# Altium footprint library Electronic Devices_LIB.PcbLib: 410 footprints (part 3 of 26)
Each footprint in its own frame and in the unit in brackets; x right, y up, seen from the top. Pads: shape width x height; smd on the part's side, far side on the other; paste and mask are expansions set on the pad; w line width, h text height; cw(c..) or ccw(c..) is an arc to the next point about the centre after c.
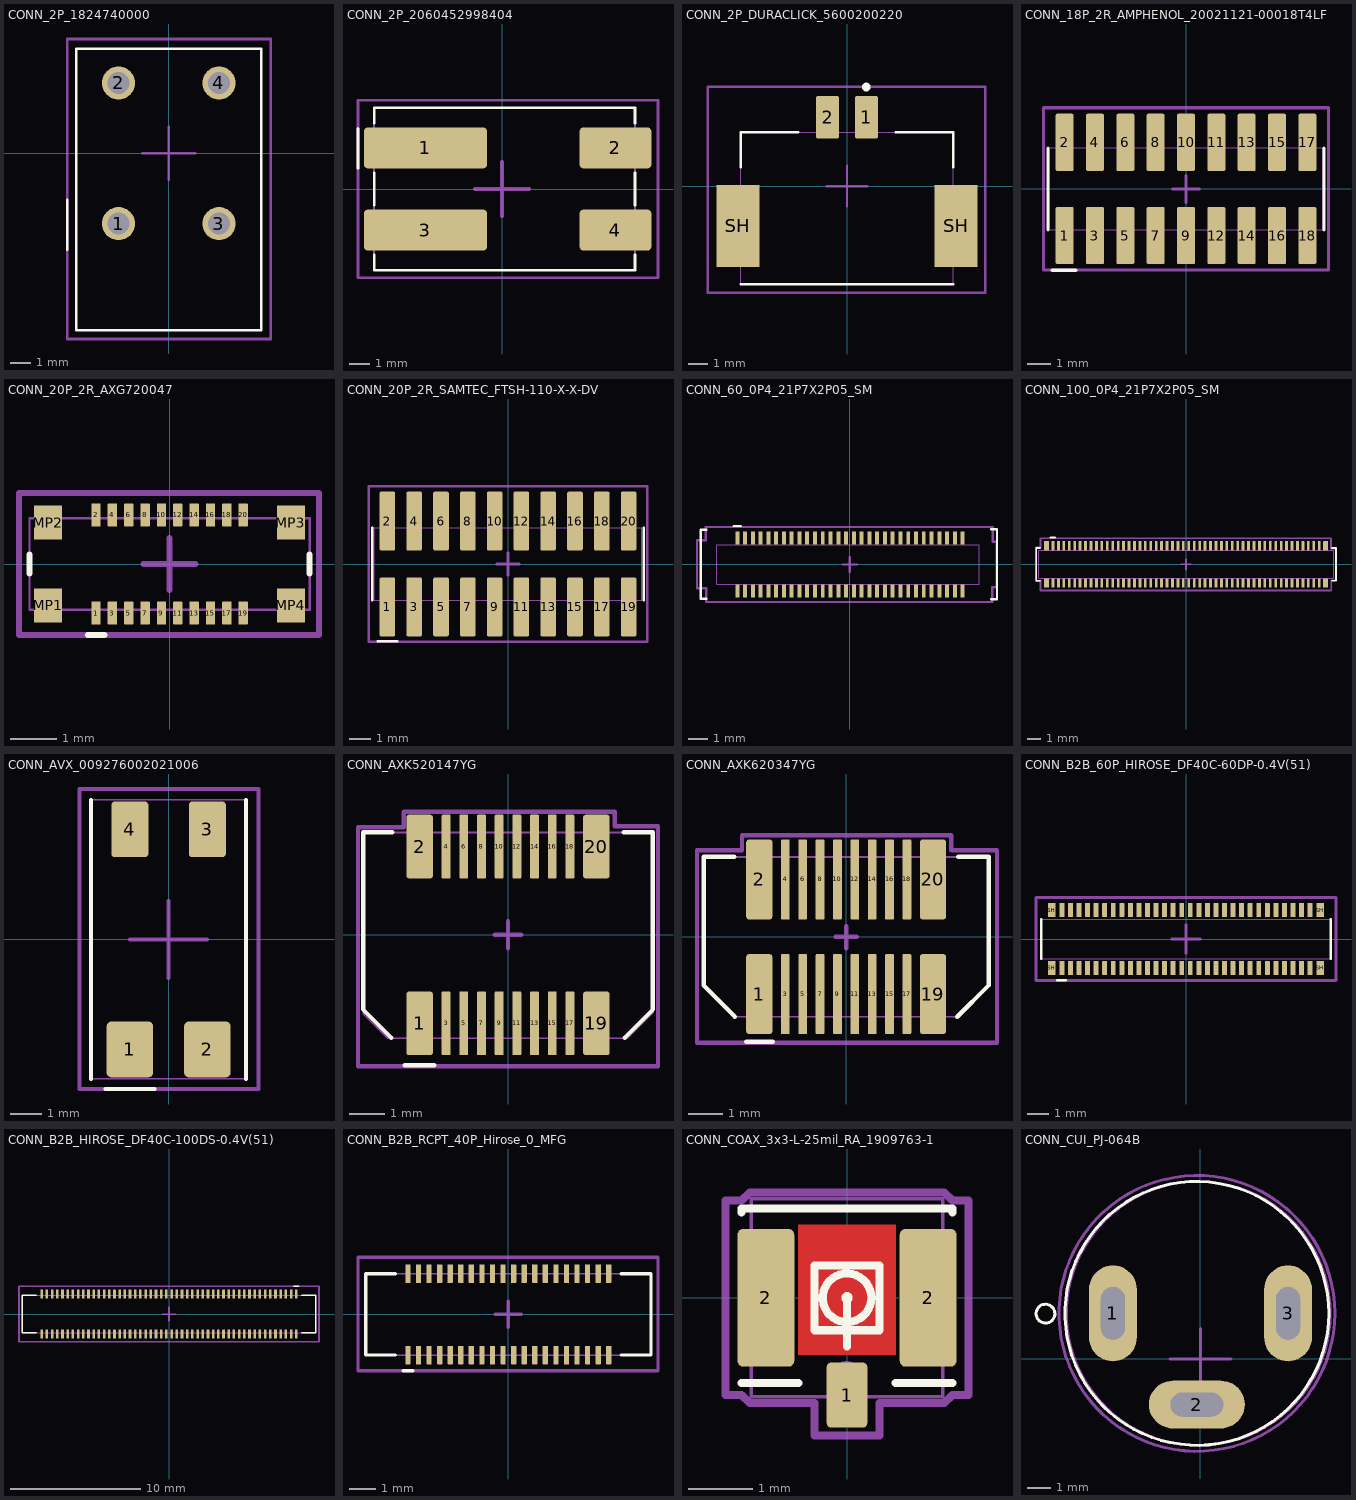
[diagram p2: the footprints below, top view; thin cyan lines are the x and y axes]

## CONN_2P_1824740000 [mm] "Horizontal with Board 0.197\" (5.00mm) Through Hole"
height 8.5
pads (4):
  round 1.65 hole 1.1: 1(-2.5,-3.5) 2(-2.5,3.5) 3(2.5,-3.5) 4(2.5,3.5)
Top Overlay:
  lines w0.127: -5.055,-4.801 -5.055,-2.311 ; -4.6,-8.8 4.6,-8.8 4.6,5.2 -4.6,5.2 -4.6,-8.8
Top Assembly:
  lines w0.051: -4.6,-8.8 -4.6,5.2 4.6,5.2 4.6,-8.8 -4.6,-8.8
  text ".Designator" at -2.246,-1.451 h0.51
Top Courtyard:
  lines w0.127: -1.321,0 0,0 ; 0,-1.321 0,0 ; 0,1.321 0,0 ; 1.321,0 0,0 ; -5.055,-9.246 5.08,-9.246 5.08,5.69 -5.055,5.69 -5.055,-9.246
3D body "1824740000.stp": height 12, standoff 0, extent -4.513,-8.824 4.587,5.176

## CONN_2P_2060452998404 [mm] "Terminal Block Horizontal with Board 0.157\" (4.00mm) Surface Mount"
height 4
pads (4):
  rrect20% 6x2 smd: 1(-3.725,2) 3(-3.725,-2)
  rrect20% 3.5x2 smd: 2(5.525,2) 4(5.525,-2)
Top Overlay:
  lines w0.127: -7.01,1.016 -7.01,2.946 ; -6.225,-3.2 -6.225,-3.95 6.475,-3.95 6.475,-3.2 ; -6.225,-0.8 -6.225,0.8 ; -6.225,3.2 -6.225,3.95 6.475,3.95 6.475,3.2 ; 6.475,-0.8 6.475,0.8
Top Assembly:
  text ".Designator" at -2.134,-0.059 h0.51
Top Courtyard:
  lines w0.127: -7.01,-4.318 7.595,-4.318 7.595,4.318 -7.01,4.318 -7.01,-4.318
  lines w0.2: -1.321,0 0,0 ; 0,-1.321 0,0 ; 0,1.321 0,0 ; 1.321,0 0,0
Top 3D Body:
  lines w0.1: -6.225,-3.95 6.475,-3.95 6.475,3.95 -6.225,3.95 -6.225,-3.95
3D body "2060-452_998-404.stp": height 4.5, standoff 0, extent -6.55,-3.95 6.55,3.95

## CONN_2P_DURACLICK_5600200220 [mm]
pads (4):
  rrect20% 1.2x2.2 smd: 1(1,3.53) 2(-1,3.53)
  rect 2.2x4.2 smd: SH(-5.6,-2.05) SH(5.6,-2.05)
Top Overlay:
  lines w0.127: -5.45,-5.05 5.45,-5.05 ; -5.45,0.95 -5.45,2.75 -2.5,2.75 ; 2.5,2.75 5.45,2.75 5.45,0.95
  lines w0.25: 0.891,5.08 ccw(c0.991,5.08) 1.091,5.08 ccw(c0.991,5.08) 0.891,5.08
Top Assembly:
  lines w0.051: -5.45,-5.05 5.45,-5.05 5.45,2.75 -5.45,2.75 -5.45,-5.05
  text ".Designator" at -2.667,-0.212 h0.51
Top Courtyard:
  lines w0.127: -1.041,0 0,0 ; 0,-1.041 0,0 ; 0,1.041 0,0 ; 1.041,0 0,0 ; -7.137,-5.486 -7.137,5.105 7.087,5.105 7.087,-5.486 -7.137,-5.486
3D body "560020-0220.stp": height 8, standoff 0, extent -5.45,-4.9 5.45,4.25

## CONN_18P_2R_AMPHENOL_20021121-00018T4LF [mm]
height 4.55
pads (18):
  rrect20% 0.76x2.4 smd: 1(-5.08,-1.95) 2(-5.08,1.95) 3(-3.81,-1.95) 4(-3.81,1.95) 5(-2.54,-1.95) 6(-2.54,1.95) 7(-1.27,-1.95) 8(-1.27,1.95) 9(0,-1.95) 10(0,1.95) 11(1.27,1.95) 12(1.27,-1.95) 13(2.54,1.95) 14(2.54,-1.95) 15(3.81,1.95) 16(3.81,-1.95) 17(5.08,1.95) 18(5.08,-1.95)
Top Overlay:
  lines w0.127: -5.773,-1.715 -5.773,1.715 ; -5.613,-3.404 -4.597,-3.404 ; 5.773,-1.715 5.773,1.715
Top Assembly:
  lines w0.051: -5.715,-1.715 5.715,-1.715 5.715,1.715 -5.715,1.715 -5.715,-1.715
  text ".Designator" at -2.591,-0.059 h0.51
Top Courtyard:
  lines w0.127: -0.559,0 0,0 ; 0,-0.559 0,0 ; 0,0.559 0,0 ; 0.559,0 0,0 ; -5.965,-3.4 5.965,-3.4 5.965,3.4 -5.965,3.4 -5.965,-3.4
3D body "20021121-00018T4LF.step": height 4.56, standoff 0.01, extent -5.715,-2.75 5.715,2.75

## CONN_20P_2R_AXG720047 [mm]
pads (24):
  rrect20% 0.2x0.5 smd mask+0.076: 1(-1.575,-1.05) 2(-1.575,1.05) 3(-1.225,-1.05) 4(-1.225,1.05) 5(-0.875,-1.05) 6(-0.875,1.05) 7(-0.525,-1.05) 8(-0.525,1.05) 9(-0.175,-1.05) 10(-0.175,1.05) 11(0.175,-1.05) 12(0.175,1.05) 13(0.525,-1.05) 14(0.525,1.05) 15(0.875,-1.05) 16(0.875,1.05) 17(1.225,-1.05) 18(1.225,1.05) 19(1.575,-1.05) 20(1.575,1.05)
  rect 0.6x0.73 smd: MP1(-2.6,-0.885) MP2(-2.6,0.885) MP3(2.6,0.885) MP4(2.6,-0.885)
Top Overlay:
  lines w0.127: -3,-0.2 -3,0.2 ; -1.753,-1.524 -1.397,-1.524 ; 3,-0.2 3,0.2
Top Assembly:
  lines w0.051: -3,-0.98 -3,0.98 3,0.98 3,-0.98 -3,-0.98
  text ".Designator" at -2.464,-0.085 h0.51
Top Courtyard:
  lines w0.127: -0.559,0 0,0 ; 0,-0.559 0,0 ; 0,0.559 0,0 ; 0.559,0 0,0 ; -3.226,-1.524 -3.226,1.524 3.2,1.524 3.2,-1.524 -3.226,-1.524
3D body "AXG72004x.STEP": height 0.59, standoff -0.03, extent -3.025,-1.1 3.025,1.1

## CONN_20P_2R_SAMTEC_FTSH-110-X-X-DV [mm]
pads (20):
  rrect20% 0.74x2.79 smd: 1(-5.715,-2.035) 2(-5.715,2.035) 3(-4.445,-2.035) 4(-4.445,2.035) 5(-3.175,-2.035) 6(-3.175,2.035) 7(-1.905,-2.035) 8(-1.905,2.035) 9(-0.635,-2.035) 10(-0.635,2.035) 11(0.635,-2.035) 12(0.635,2.035) 13(1.905,-2.035) 14(1.905,2.035) 15(3.175,-2.035) 16(3.175,2.035) 17(4.445,-2.035) 18(4.445,2.035) 19(5.715,-2.035) 20(5.715,2.035)
Top Overlay:
  lines w0.127: -6.435,-1.715 -6.435,1.715 ; -6.172,-3.658 -5.258,-3.658 ; 6.435,-1.715 6.435,1.715
Top Assembly:
  lines w0.051: -6.35,-1.715 6.35,-1.715 6.35,1.715 -6.35,1.715 -6.35,-1.715
  text ".Designator" at -2.464,-0.136 h0.51
Top Courtyard:
  lines w0.127: -0.533,0 0,0 ; 0,-0.533 0,0 ; 0,0.533 0,0 ; 0.533,0 0,0 ; -6.6,-3.68 6.6,-3.68 6.6,3.68 -6.6,3.68 -6.6,-3.68
3D body "FTSH-110-01-L-DV.step": height 5.98, standoff 0.01, extent -6.35,-2.921 6.35,2.921

## CONN_60_0P4_21P7X2P05_SM [mil] "CON_60_0P4_21P7X2P05_SM"
height 57.09
pads (60):
  rrect20% 8x27 smd: 1(-228.35,53.85) 2(-228.35,-53.85) 3(-212.6,53.85) 4(-212.6,-53.85) 5(-196.85,53.85) 6(-196.85,-53.85) 7(-181.1,53.85) 8(-181.1,-53.85) 9(-165.35,53.85) 10(-165.35,-53.85) 11(-149.61,53.85) 12(-149.61,-53.85) 13(-133.86,53.85) 14(-133.86,-53.85) 15(-118.11,53.85) 16(-118.11,-53.85) 17(-102.36,53.85) 18(-102.36,-53.85) 19(-86.61,53.85) 20(-86.61,-53.85) 21(-70.87,53.85) 22(-70.87,-53.85) 23(-55.12,53.85) 24(-55.12,-53.85) 25(-39.37,53.85) 26(-39.37,-53.85) 27(-23.62,53.85) 28(-23.62,-53.85) 29(-7.87,53.85) 30(-7.87,-53.85) 31(7.87,53.85) 32(7.87,-53.85) 33(23.62,53.85) 34(23.62,-53.85) 35(39.37,53.85) 36(39.37,-53.85) 37(55.12,53.85) 38(55.12,-53.85) 39(70.87,53.85) 40(70.87,-53.85) 41(86.61,53.85) 42(86.61,-53.85) 43(102.36,53.85) 44(102.36,-53.85) 45(118.11,53.85) 46(118.11,-53.85) 47(133.86,53.85) 48(133.86,-53.85) 49(149.61,53.85) 50(149.61,-53.85) 51(165.35,53.85) 52(165.35,-53.85) 53(181.1,53.85) 54(181.1,-53.85) 55(196.85,53.85) 56(196.85,-53.85) 57(212.6,53.85) 58(212.6,-53.85) 59(228.35,53.85) 60(228.35,-53.85)
Top Overlay:
  lines w5: -290.75,-69 -302.08,-69 -302.08,70 -290.75,70 ; -235.52,78 -221.52,78 ; 286.71,-70 298.04,-70 298.04,71 286.71,71
Top Assembly:
  lines w2: -270.08,-40.35 -270.08,40.35 261.81,40.35 261.81,-40.35 -270.08,-40.35
  text ".Designator" at -91.5,-10.04 h20
Top Courtyard:
  lines w5: -15,0 0,0 ; 0,-15 0,0 ; 0,15 0,0 ; 15,0 0,0 ; -310,-48 -291,-48 -291,-76 288,-76 288,-46 298,-46 298,46 289,46 289,76 -292,76 -292,49 -310,49 -310,-48
3D body "df40c-60ds-0_4v_51_.stp": height 57.59, standoff 0.5, extent -288.4,-66 286.4,67.07

## CONN_100_0P4_21P7X2P05_SM [mil] "CON100_0P4_21P7X2P05_SM"
pads (104):
  rrect20% 8x27 smd paste+0 mask+3: 1(-385.83,53.85) 2(-385.83,-53.85) 3(-370.08,53.85) 4(-370.08,-53.85) 5(-354.33,53.85) 6(-354.33,-53.85) 7(-338.58,53.85) 8(-338.58,-53.85) 9(-322.83,53.85) 10(-322.83,-53.85) 11(-307.09,53.85) 12(-307.09,-53.85) 13(-291.34,53.85) 14(-291.34,-53.85) 15(-275.59,53.85) 16(-275.59,-53.85) 17(-259.84,53.85) 18(-259.84,-53.85) 19(-244.09,53.85) 20(-244.09,-53.85) 21(-228.35,53.85) 22(-228.35,-53.85) 23(-212.6,53.85) 24(-212.6,-53.85) 25(-196.85,53.85) 26(-196.85,-53.85) 27(-181.1,53.85) 28(-181.1,-53.85) 29(-165.35,53.85) 30(-165.35,-53.85) 31(-149.61,53.85) 32(-149.61,-53.85) 33(-133.86,53.85) 34(-133.86,-53.85) 35(-118.11,53.85) 36(-118.11,-53.85) 37(-102.36,53.85) 38(-102.36,-53.85) 39(-86.61,53.85) 40(-86.61,-53.85) 41(-70.87,53.85) 42(-70.87,-53.85) 43(-55.12,53.85) 44(-55.12,-53.85) 45(-39.37,53.85) 46(-39.37,-53.85) 47(-23.62,53.85) 48(-23.62,-53.85) 49(-7.87,53.85) 50(-7.87,-53.85) 51(7.87,53.85) 52(7.87,-53.85) 53(23.62,53.85) 54(23.62,-53.85) 55(39.37,53.85) 56(39.37,-53.85) 57(55.12,53.85) 58(55.12,-53.85) 59(70.87,53.85) 60(70.87,-53.85) 61(86.61,53.85) 62(86.61,-53.85) 63(102.36,53.85) 64(102.36,-53.85) 65(118.11,53.85) 66(118.11,-53.85) 67(133.86,53.85) 68(133.86,-53.85) 69(149.61,53.85) 70(149.61,-53.85) 71(165.35,53.85) 72(165.35,-53.85) 73(181.1,53.85) 74(181.1,-53.85) 75(196.85,53.85) 76(196.85,-53.85) 77(212.6,53.85) 78(212.6,-53.85) 79(228.35,53.85) 80(228.35,-53.85) 81(244.09,53.85) 82(244.09,-53.85) 83(259.84,53.85) 84(259.84,-53.85) 85(275.59,53.85) 86(275.59,-53.85) 87(291.34,53.85) 88(291.34,-53.85) 89(307.09,53.85) 90(307.09,-53.85) 91(322.83,53.85) 92(322.83,-53.85) 93(338.58,53.85) 94(338.58,-53.85) 95(354.33,53.85) 96(354.33,-53.85) 97(370.08,53.85) 98(370.08,-53.85) 99(385.83,53.85) 100(385.83,-53.85)
  rrect20% 14x27 smd paste+0 mask+3: SH(-404.53,-53.85) SH(-404.53,53.85) SH(404.53,-53.85) SH(404.53,53.85)
Top Overlay:
  lines w5: -423.23,-47.35 -434.56,-47.35 -434.56,47.35 -423.23,47.35 ; -393,78 -379,78 ; 423.23,-47.35 434.56,-47.35 434.56,47.35 423.23,47.35
Top Assembly:
  lines w2: -427.56,-40.35 427.56,-40.35 427.56,40.35 -427.56,40.35 -427.56,-40.35
  text ".Designator" at -78,-6.34 h20
Top Courtyard:
  lines w5: -15,0 0,0 ; 0,-15 0,0 ; 0,15 0,0 ; 15,0 0,0 ; -435,-48 -435,49 -422,49 -422,76 420,76 420,46 434,46 434,-46 421,-46 421,-76 -422,-76 -422,-48 -435,-48
3D body "DF40C-100DP-0.4V_51_.stp": height 45.38, standoff 0.5, extent -423.62,-58.93 423.62,58

## CONN_AVX_009276002021006 [mm] "Pitch 2.50mm"
height 5
pads (4):
  rrect20% 1.5x1.8 smd: 1(-1.25,-3.55) 2(1.25,-3.55)
  rrect20% 1.2x1.8 smd: 3(1.25,3.55) 4(-1.25,3.55)
Top Overlay:
  lines w0.127: -2.032,-4.826 -0.457,-4.826 ; -2.5,-4.5 -2.5,4.5 -2.5,-4.5 ; 2.5,-4.5 2.5,4.5 2.5,-4.5
Top Assembly:
  lines w0.051: -2.5,-4.5 2.5,-4.5 2.5,4.5 -2.5,4.5 -2.5,-4.5
  text ".Designator" at -2.642,-0.186 h0.51
Top Courtyard:
  lines w0.127: -1.245,0 0,0 ; 0,-1.245 0,0 ; 0,1.245 0,0 ; 1.245,0 0,0 ; -2.87,-4.826 -2.87,4.851 2.896,4.851 2.896,-4.826 -2.87,-4.826
3D body "009276002021006.stp": height 5.1, standoff 0, extent -2.5,-4.5 2.5,4.5

## CONN_AXK520147YG [mm] "0.020\" (0.50mm)"
height 2.4
pads (20):
  rrect20% 0.75x1.8 smd paste-10: 1(-2.5,-2.5) 2(-2.5,2.5) 19(2.5,-2.5) 20(2.5,2.5)
  rrect20% 0.25x1.8 smd paste-10: 3(-1.75,-2.5) 4(-1.75,2.5) 5(-1.25,-2.5) 6(-1.25,2.5) 7(-0.75,-2.5) 8(-0.75,2.5) 9(-0.25,-2.5) 10(-0.25,2.5) 11(0.25,-2.5) 12(0.25,2.5) 13(0.75,-2.5) 14(0.75,2.5) 15(1.25,-2.5) 16(1.25,2.5) 17(1.75,-2.5) 18(1.75,2.5)
Top Overlay:
  lines w0.127: -3.308,-2.9 -4.1,-2.108 -4.1,2.9 -3.272,2.9 ; -2.921,-3.683 -2.083,-3.683 ; 3.272,2.9 4.1,2.9 4.1,-2.108 3.308,-2.9
Top Paste:
  rectangle: -2.485,-3.175 -2.135,-1.825
  region: 2.485,-1.825 2.135,-1.825 2.135,-3.175 2.485,-3.175
  region: 1.865,-1.825 1.635,-1.825 1.635,-3.175 1.865,-3.175
  region: 1.365,-1.825 1.135,-1.825 1.135,-3.175 1.365,-3.175
  region: 0.865,-1.825 0.635,-1.825 0.635,-3.175 0.865,-3.175
  region: 0.365,-1.825 0.135,-1.825 0.135,-3.175 0.365,-3.175
  region: -0.135,-1.825 -0.365,-1.825 -0.365,-3.175 -0.135,-3.175
  region: -0.635,-1.825 -0.865,-1.825 -0.865,-3.175 -0.635,-3.175
  region: -1.135,-1.825 -1.365,-1.825 -1.365,-3.175 -1.135,-3.175
  region: -1.635,-1.825 -1.865,-1.825 -1.865,-3.175 -1.635,-3.175
  region: 2.485,3.175 2.135,3.175 2.135,1.825 2.485,1.825
  rectangle: -2.485,1.825 -2.135,3.175
  rectangle: -1.865,1.825 -1.635,3.175
  rectangle: -1.365,1.825 -1.135,3.175
  rectangle: -0.865,1.825 -0.635,3.175
  rectangle: -0.365,1.825 -0.135,3.175
  rectangle: 0.135,1.825 0.365,3.175
  rectangle: 0.635,1.825 0.865,3.175
  rectangle: 1.135,1.825 1.365,3.175
  rectangle: 1.635,1.825 1.865,3.175
Top Solder:
  region: 2.535,-1.775 2.085,-1.775 2.085,-3.225 2.535,-3.225
  region: 1.915,-1.775 1.585,-1.775 1.585,-3.225 1.915,-3.225
  region: 1.415,-1.775 1.085,-1.775 1.085,-3.225 1.415,-3.225
  region: 0.915,-1.775 0.585,-1.775 0.585,-3.225 0.915,-3.225
  region: 0.415,-1.775 0.085,-1.775 0.085,-3.225 0.415,-3.225
  region: -0.085,-1.775 -0.415,-1.775 -0.415,-3.225 -0.085,-3.225
  region: -0.585,-1.775 -0.915,-1.775 -0.915,-3.225 -0.585,-3.225
  region: -1.085,-1.775 -1.415,-1.775 -1.415,-3.225 -1.085,-3.225
  region: -1.585,-1.775 -1.915,-1.775 -1.915,-3.225 -1.585,-3.225
  rectangle: -2.535,-3.225 -2.085,-1.775
  rectangle: -2.535,1.775 -2.085,3.225
  rectangle: -1.915,1.775 -1.585,3.225
  rectangle: -1.415,1.775 -1.085,3.225
  rectangle: -0.915,1.775 -0.585,3.225
  rectangle: -0.415,1.775 -0.085,3.225
  rectangle: 0.085,1.775 0.415,3.225
  rectangle: 0.585,1.775 0.915,3.225
  rectangle: 1.085,1.775 1.415,3.225
  rectangle: 1.585,1.775 1.915,3.225
  region: 2.535,3.225 2.085,3.225 2.085,1.775 2.535,1.775
Top Assembly:
  circle w0.1: c-2.485,-1.95 r0.221
  circle w0.1: c-2.485,-1.95 r0.221
  lines w0.051: -4.089,-2.235 -3.404,-2.921 3.378,-2.921 4.1,-2.199 4.1,2.9 -4.089,2.9 -4.089,-2.235
  text ".Designator" at -2.489,-0.085 h0.51
Top Courtyard:
  lines w0.127: -0.381,0 0,0 ; 0,-0.381 0,0 ; 0,0.381 0,0 ; 0.381,0 0,0 ; -4.242,-3.708 -4.242,3.048 -2.946,3.048 -2.946,3.48 3.023,3.48 3.023,3.073 4.242,3.073 4.242,-3.708 -3.607,-3.708 -4.242,-3.708
3D body "axk520147y.stp": height 2.35, standoff 0, extent -4.1,-2.9 4.1,2.9

## CONN_AXK620347YG [mm] "0.020\" (0.50mm)"
height 2.4
pads (20):
  rrect20% 0.75x2.3 smd paste-10 mask+0.076: 1(-2.5,-1.65) 2(-2.5,1.65) 19(2.5,-1.65) 20(2.5,1.65)
  rrect20% 0.25x2.3 smd paste-10 mask+0.076: 3(-1.75,-1.65) 4(-1.75,1.65) 5(-1.25,-1.65) 6(-1.25,1.65) 7(-0.75,-1.65) 8(-0.75,1.65) 9(-0.25,-1.65) 10(-0.25,1.65) 11(0.25,-1.65) 12(0.25,1.65) 13(0.75,-1.65) 14(0.75,1.65) 15(1.25,-1.65) 16(1.25,1.65) 17(1.75,-1.65) 18(1.75,1.65)
Top Overlay:
  lines w0.127: -3.225,2.3 -4.1,2.3 -4.1,-1.4 -3.2,-2.3 ; -2.87,-3.023 -2.108,-3.023 ; 3.2,-2.3 4.1,-1.4 4.1,2.3 3.225,2.3
Top Paste:
  rectangle: 1.635,-2.625 1.865,-0.675
  rectangle: 1.135,-2.625 1.365,-0.675
  rectangle: 0.635,-2.625 0.865,-0.675
  rectangle: 0.135,-2.625 0.365,-0.675
  rectangle: -0.365,-2.625 -0.135,-0.675
  rectangle: -0.865,-2.625 -0.635,-0.675
  rectangle: -1.365,-2.625 -1.135,-0.675
  rectangle: -1.865,-2.625 -1.635,-0.675
  rectangle: -2.485,-2.625 -2.135,-0.675
  region: 2.485,-0.675 2.135,-0.675 2.135,-2.625 2.485,-2.625
  rectangle: 1.635,0.675 1.865,2.625
  rectangle: 1.135,0.675 1.365,2.625
  rectangle: 0.635,0.675 0.865,2.625
  rectangle: 0.135,0.675 0.365,2.625
  rectangle: -0.365,0.675 -0.135,2.625
  rectangle: -0.865,0.675 -0.635,2.625
  rectangle: -1.365,0.675 -1.135,2.625
  rectangle: -1.865,0.675 -1.635,2.625
  rectangle: -2.485,0.675 -2.135,2.625
  region: 2.485,2.625 2.135,2.625 2.135,0.675 2.485,0.675
Top Solder:
  rectangle: -2.535,-2.675 -2.085,-0.625
  rectangle: -1.915,-2.675 -1.585,-0.625
  rectangle: -1.415,-2.675 -1.085,-0.625
  rectangle: -0.915,-2.675 -0.585,-0.625
  rectangle: -0.415,-2.675 -0.085,-0.625
  rectangle: 0.085,-2.675 0.415,-0.625
  rectangle: 0.585,-2.675 0.915,-0.625
  rectangle: 1.085,-2.675 1.415,-0.625
  rectangle: 1.585,-2.675 1.915,-0.625
  region: 2.535,-0.625 2.085,-0.625 2.085,-2.675 2.535,-2.675
  region: 2.535,2.675 2.085,2.675 2.085,0.625 2.535,0.625
  rectangle: 1.585,0.625 1.915,2.675
  rectangle: 1.085,0.625 1.415,2.675
  rectangle: 0.585,0.625 0.915,2.675
  rectangle: 0.085,0.625 0.415,2.675
  rectangle: -0.415,0.625 -0.085,2.675
  rectangle: -0.915,0.625 -0.585,2.675
  rectangle: -1.415,0.625 -1.085,2.675
  rectangle: -1.915,0.625 -1.585,2.675
  rectangle: -2.535,0.625 -2.085,2.675
Top Assembly:
  circle w0.1: c-2.485,-1.75 r0.221
  lines w0.051: -4.1,-1.4 -4.1,2.3 4.1,2.3 4.1,-1.4 3.2,-2.3 -3.2,-2.3 -4.1,-1.4
  text "'.Designator'" at -2.565,0.576 h0.51
Top Courtyard:
  lines w0.127: -4.293,2.464 -4.293,-3.048 4.343,-3.048 4.343,2.489 3.023,2.489 3.023,2.921 -2.997,2.921 -2.997,2.515 ; -4.293,2.489 -2.997,2.489 ; -0.305,0 0,0 ; 0,-0.33 0,-0.025 ; 0,0.305 0,0 ; 0.305,0 0,0
3D body "axk620347y.stp": height 2.4, standoff 0, extent -4.1,-2.3 4.1,2.3

## CONN_B2B_60P_HIROSE_DF40C-60DP-0.4V(51) [mm]
pads (64):
  rrect20% 0.23x0.66 smd paste-1 mask+0.076: 1(-5.8,-1.355) 2(-5.8,1.355) 3(-5.4,-1.355) 4(-5.4,1.355) 5(-5,-1.355) 6(-5,1.355) 7(-4.6,-1.355) 8(-4.6,1.355) 9(-4.2,-1.355) 10(-4.2,1.355) 11(-3.8,-1.355) 12(-3.8,1.355) 13(-3.4,-1.355) 14(-3.4,1.355) 15(-3,-1.355) 16(-3,1.355) 17(-2.6,-1.355) 18(-2.6,1.355) 19(-2.2,-1.355) 20(-2.2,1.355) 21(-1.8,-1.355) 22(-1.8,1.355) 23(-1.4,-1.355) 24(-1.4,1.355) 25(-1,-1.355) 26(-1,1.355) 27(-0.6,-1.355) 28(-0.6,1.355) 29(-0.2,-1.355) 30(-0.2,1.355) 31(0.2,-1.355) 32(0.2,1.355) 33(0.6,-1.355) 34(0.6,1.355) 35(1,-1.355) 36(1,1.355) 37(1.4,-1.355) 38(1.4,1.355) 39(1.8,-1.355) 40(1.8,1.355) 41(2.2,-1.355) 42(2.2,1.355) 43(2.6,-1.355) 44(2.6,1.355) 45(3,-1.355) 46(3,1.355) 47(3.4,-1.355) 48(3.4,1.355) 49(3.8,-1.355) 50(3.8,1.355) 51(4.2,-1.355) 52(4.2,1.355) 53(4.6,-1.355) 54(4.6,1.355) 55(5,-1.355) 56(5,1.355) 57(5.4,-1.355) 58(5.4,1.355) 59(5.8,-1.355) 60(5.8,1.355)
  rrect20% 0.35x0.66 smd paste-1 mask+0.076: SH(-6.275,-1.355) SH(-6.275,1.355) SH(6.275,-1.355) SH(6.275,1.355)
Top Overlay:
  lines w0.127: -6.76,-0.925 -6.76,0.925 ; -6.02,-1.93 -5.613,-1.93 ; 6.76,-0.925 6.76,0.925
Top Paste:
  drawing of 64 lines, arcs and shapes, not listed
Top Assembly:
  lines w0.051: -6.76,-0.925 6.76,-0.925 6.76,0.925 -6.76,0.925 -6.76,-0.925
  text ".Designator" at -2.388,-0.161 h0.51
Top Courtyard:
  lines w0.127: -0.66,0 0,0 ; 0,-0.66 0,0 ; 0,0.66 0,0 ; 0.66,0 0,0 ; -7.01,-1.935 7.01,-1.935 7.01,1.935 -7.01,1.935 -7.01,-1.935
3D body "DF40C-60DP.stp": height 1.14, standoff 0, extent -6.76,-1.499 6.76,1.471

## CONN_B2B_HIROSE_DF40C-100DS-0.4V(51) [mm] "0.016\" (0.40mm)"
height 1.65
pads (100):
  rrect20% 0.2x0.7 smd paste-1: 1(9.8,1.54) 2(9.8,-1.54) 3(9.4,1.54) 4(9.4,-1.54) 5(9,1.54) 6(9,-1.54) 7(8.6,1.54) 8(8.6,-1.54) 9(8.2,1.54) 10(8.2,-1.54) 11(7.8,1.54) 12(7.8,-1.54) 13(7.4,1.54) 14(7.4,-1.54) 15(7,1.54) 16(7,-1.54) 17(6.6,1.54) 18(6.6,-1.54) 19(6.2,1.54) 20(6.2,-1.54) 21(5.8,1.54) 22(5.8,-1.54) 23(5.4,1.54) 24(5.4,-1.54) 25(5,1.54) 26(5,-1.54) 27(4.6,1.54) 28(4.6,-1.54) 29(4.2,1.54) 30(4.2,-1.54) 31(3.8,1.54) 32(3.8,-1.54) 33(3.4,1.54) 34(3.4,-1.54) 35(3,1.54) 36(3,-1.54) 37(2.6,1.54) 38(2.6,-1.54) 39(2.2,1.54) 40(2.2,-1.54) 41(1.8,1.54) 42(1.8,-1.54) 43(1.4,1.54) 44(1.4,-1.54) 45(1,1.54) 46(1,-1.54) 47(0.6,1.54) 48(0.6,-1.54) 49(0.2,1.54) 50(0.2,-1.54) 51(-0.2,1.54) 52(-0.2,-1.54) 53(-0.6,1.54) 54(-0.6,-1.54) 55(-1,1.54) 56(-1,-1.54) 57(-1.4,1.54) 58(-1.4,-1.54) 59(-1.8,1.54) 60(-1.8,-1.54) 61(-2.2,1.54) 62(-2.2,-1.54) 63(-2.6,1.54) 64(-2.6,-1.54) 65(-3,1.54) 66(-3,-1.54) 67(-3.4,1.54) 68(-3.4,-1.54) 69(-3.8,1.54) 70(-3.8,-1.54) 71(-4.2,1.54) 72(-4.2,-1.54) 73(-4.6,1.54) 74(-4.6,-1.54) 75(-5,1.54) 76(-5,-1.54) 77(-5.4,1.54) 78(-5.4,-1.54) 79(-5.8,1.54) 80(-5.8,-1.54) 81(-6.2,1.54) 82(-6.2,-1.54) 83(-6.6,1.54) 84(-6.6,-1.54) 85(-7,1.54) 86(-7,-1.54) 87(-7.4,1.54) 88(-7.4,-1.54) 89(-7.8,1.54) 90(-7.8,-1.54) 91(-8.2,1.54) 92(-8.2,-1.54) 93(-8.6,1.54) 94(-8.6,-1.54) 95(-9,1.54) 96(-9,-1.54) 97(-9.4,1.54) 98(-9.4,-1.54) 99(-9.8,1.54) 100(-9.8,-1.54)
Top Overlay:
  lines w0.127: -10.22,-1.44 -11.3,-1.44 -11.3,1.44 -10.22,1.44 ; 9.627,2.159 9.982,2.159 ; 10.22,-1.44 11.3,-1.44 11.3,1.44 10.22,1.44
Top Paste:
  drawing of 100 lines, arcs and shapes, not listed
Top Assembly:
  lines w0.051: -11.3,-1.44 -11.3,1.44 11.3,1.44 11.3,-1.44 -11.3,-1.44
  text ".Designator" at -2.667,-0.11 h0.51
Top Courtyard:
  lines w0.127: -0.508,0 0,0 ; 0,-0.508 0,0 ; 0,0.508 0,0 ; 0.508,0 0,0 ; -11.55,-2.14 -11.55,2.14 11.55,2.14 11.55,-2.14 -11.55,-2.14
3D body "step_temp.STEP": height 1.6, standoff -0.05, extent -11.3,-1.69 11.3,1.69

## CONN_B2B_RCPT_40P_Hirose_0_MFG [mm]
pads (40):
  rrect20% 0.2x0.7 smd: 1(-3.8,-1.54) 2(-3.8,1.54) 3(-3.4,-1.54) 4(-3.4,1.54) 5(-3,-1.54) 6(-3,1.54) 7(-2.6,-1.54) 8(-2.6,1.54) 9(-2.2,-1.54) 10(-2.2,1.54) 11(-1.8,-1.54) 12(-1.8,1.54) 13(-1.4,-1.54) 14(-1.4,1.54) 15(-1,-1.54) 16(-1,1.54) 17(-0.6,-1.54) 18(-0.6,1.54) 19(-0.2,-1.54) 20(-0.2,1.54) 21(0.2,-1.54) 22(0.2,1.54) 23(0.6,-1.54) 24(0.6,1.54) 25(1,-1.54) 26(1,1.54) 27(1.4,-1.54) 28(1.4,1.54) 29(1.8,-1.54) 30(1.8,1.54) 31(2.2,-1.54) 32(2.2,1.54) 33(2.6,-1.54) 34(2.6,1.54) 35(3,-1.54) 36(3,1.54) 37(3.4,-1.54) 38(3.4,1.54) 39(3.8,-1.54) 40(3.8,1.54)
Top Overlay:
  lines w0.127: -4.275,-1.54 -5.4,-1.54 -5.4,1.54 -4.275,1.54 ; -3.988,-2.134 -3.607,-2.134 ; 4.275,-1.54 5.4,-1.54 5.4,1.54 4.275,1.54
Top Paste:
  rectangle: -3.88,1.19 -3.72,1.89
  rectangle: -3.48,1.19 -3.32,1.89
  rectangle: -3.08,1.19 -2.92,1.89
  rectangle: -2.68,1.19 -2.52,1.89
  rectangle: -2.28,1.19 -2.12,1.89
  rectangle: -1.88,1.19 -1.72,1.89
  rectangle: -1.48,1.19 -1.32,1.89
  rectangle: -1.08,1.19 -0.92,1.89
  rectangle: -0.68,1.19 -0.52,1.89
  rectangle: -0.28,1.19 -0.12,1.89
  rectangle: 0.12,1.19 0.28,1.89
  rectangle: 0.52,1.19 0.68,1.89
  rectangle: 0.92,1.19 1.08,1.89
  rectangle: 1.32,1.19 1.48,1.89
  rectangle: 1.72,1.19 1.88,1.89
  rectangle: 2.12,1.19 2.28,1.89
  rectangle: 2.52,1.19 2.68,1.89
  rectangle: 2.92,1.19 3.08,1.89
  rectangle: 3.32,1.19 3.48,1.89
  rectangle: 3.72,1.19 3.88,1.89
  rectangle: -3.88,-1.89 -3.72,-1.19
  rectangle: -3.48,-1.89 -3.32,-1.19
  rectangle: -3.08,-1.89 -2.92,-1.19
  rectangle: -2.68,-1.89 -2.52,-1.19
  rectangle: -2.28,-1.89 -2.12,-1.19
  rectangle: -1.88,-1.89 -1.72,-1.19
  rectangle: -1.48,-1.89 -1.32,-1.19
  rectangle: -1.08,-1.89 -0.92,-1.19
  rectangle: -0.68,-1.89 -0.52,-1.19
  rectangle: -0.28,-1.89 -0.12,-1.19
  rectangle: 0.12,-1.89 0.28,-1.19
  rectangle: 0.52,-1.89 0.68,-1.19
  rectangle: 0.92,-1.89 1.08,-1.19
  rectangle: 1.32,-1.89 1.48,-1.19
  rectangle: 1.72,-1.89 1.88,-1.19
  rectangle: 2.12,-1.89 2.28,-1.19
  rectangle: 2.52,-1.89 2.68,-1.19
  rectangle: 2.92,-1.89 3.08,-1.19
  rectangle: 3.32,-1.89 3.48,-1.19
  rectangle: 3.72,-1.89 3.88,-1.19
Top Assembly:
  lines w0.051: -5.4,-1.54 5.4,-1.54 5.4,1.54 -5.4,1.54 -5.4,-1.54
Top Courtyard:
  lines w0.127: -0.5,0 0.5,0 ; 0,-0.5 0,0.5 ; -5.69,-2.134 5.664,-2.134 5.664,2.159 -5.69,2.159 -5.69,-2.134
3D body "Conn_Hirose_DF40C-40DS-0_4V_51_eec.STEP": height 0.25, standoff 0, extent -5.5,-1.99 5.5,1.99

## CONN_COAX_3x3-L-25mil_RA_1909763-1 [mil] "1909763-1_TE_Coax_RightAngle_SMD_3x3mm_20mil Feed"
height 49.21
pads (3):
  rrect20% 25x40 smd mask+3: 1(0,-60)
  rrect20% 35x85 smd mask+3: 2(-50,0) 2(50,0)
Top Layer:
  pour cut-out: -30,45 -30,-35 30,-35 30,45
Top Overlay:
  circle w5: c0,0 r1
  circle w5: c0,0 r15
  lines w5: -65,-52.5 -30,-52.5 ; -65,52.5 -65,55 65,55 65,52.5 ; 0,-30 0,0 ; 30,-52.5 65,-52.5 ; -20,-20 -20,20 20,20 20,-20 -20,-20
Top Assembly:
  circle w2: c0,-50 r10
  lines w2: -59,-61 -59,61 59,61 59,-61 -59,-61
  text ".Designator" at -105,-8.34 h20
Top Courtyard:
  lines w5: -10,0 10,0 ; 0,-10 0,10 ; -75,-60 -75,60 -65,60 -60,65 60,65 65,60 75,60 75,-60 65,-60 60,-65 20,-65 20,-85 -20,-85 -20,-65 -60,-65 -65,-60 -75,-60
3D body "U_FL-R-SMT(10).STEP": height 49.21, standoff 0, extent -59.06,-61.02 59.06,61.03

## CONN_CUI_PJ-064B [mm] "Power Barrel Connector Jack 2.50mm ID (0.098\"), 5.50mm OD (0.217\") Panel Mount"
height 22.1
pads (3):
  oval 2x4 hole 1 slot 2.2 at 90 deg: 1(-3.65,1.9) 3(3.65,1.9)
  oval 4x2 hole 1 slot 2.2 at 0 deg: 2(-0.15,-1.9)
Top Overlay:
  circle w0.127: c-0.15,1.9 r5.5
  circle w0.127: c-6.465,1.89 r0.393
  circle w0.051: c-0.15,1.9 r5.5
Top Assembly:
  circle w0.127: c-0.094,1.9 r5.5
  circle w0.127: c-3.65,1.9 r0.2
  text ".Designator" at -2.583,1.739 h0.51
Top Courtyard:
  circle w0.127: c-0.15,1.9 r5.75
  lines w0.127: -1.27,0 0,0 ; 0,-1.27 0,0 ; 0,1.27 0,0 ; 1.27,0 0,0
3D body "CUI_DEVICES_PJ-064B.step": height 18, standoff -3.89, extent -5.65,-3.64 5.35,7.45